# Altium footprint library pre_CONNECTOR.PcbLib: 64 footprints (part 4 of 4)
Each footprint in its own frame and in the unit in brackets; x right, y up, seen from the top. Pads: shape width x height; smd on the part's side, far side on the other; paste and mask are expansions set on the pad; w line width, h text height; cw(c..) or ccw(c..) is an arc to the next point about the centre after c.
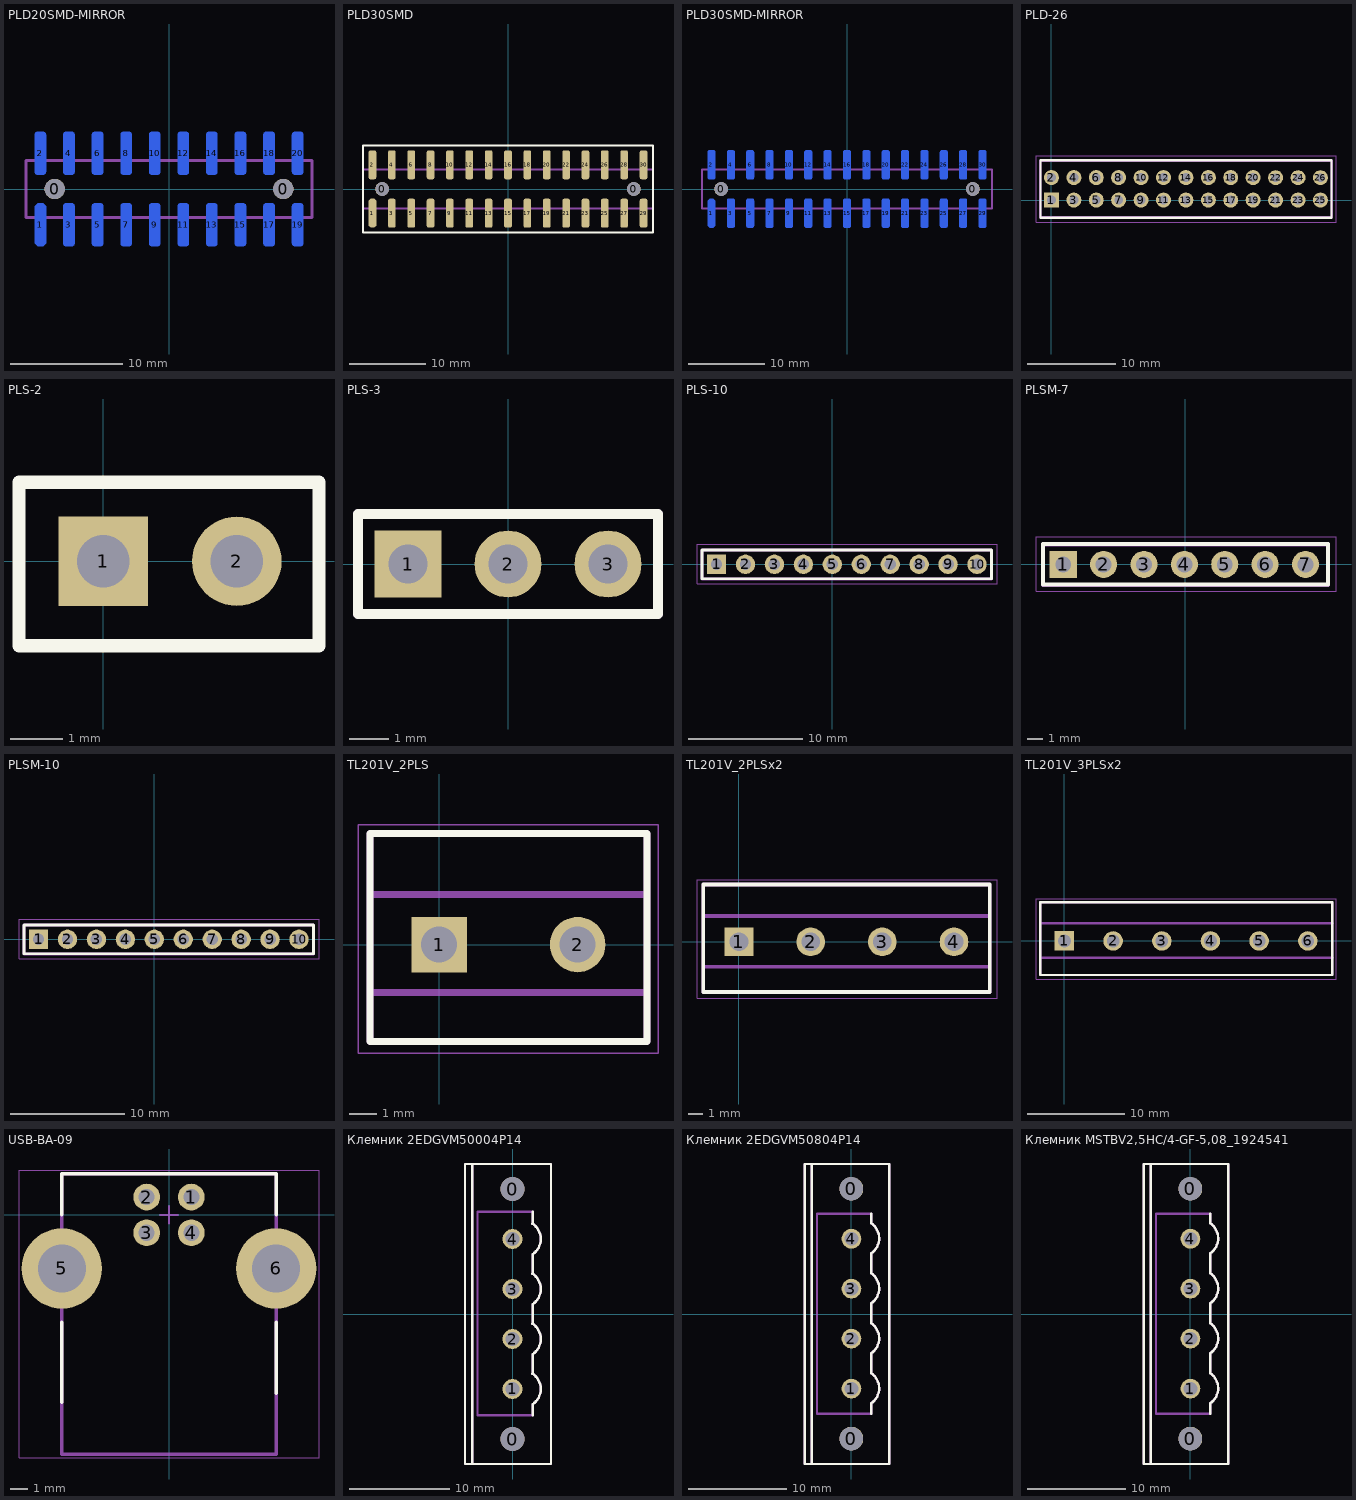
[diagram p3: the footprints below, top view; thin cyan lines are the x and y axes]

## PLD20SMD-MIRROR [mm]
height 3.8
pads (22):
  round 1.8 hole 1.8 unplated: 0(-10.16,0) 0(10.16,0)
  oct 1x3.8 smd far side: 1(-11.43,-3.175)
  rrect50% 1x3.8 smd far side: 2(-11.43,3.175) 3(-8.89,-3.175) 4(-8.89,3.175) 5(-6.35,-3.175) 6(-6.35,3.175) 7(-3.81,-3.175) 8(-3.81,3.175) 9(-1.27,-3.175) 10(-1.27,3.175) 11(1.27,-3.175) 12(1.27,3.175) 13(3.81,-3.175) 14(3.81,3.175) 15(6.35,-3.175) 16(6.35,3.175) 17(8.89,-3.175) 18(8.89,3.175) 19(11.43,-3.175) 20(11.43,3.175)
Bottom Overlay:
  lines w0.254: -12.7,-5.715 12.7,-5.715 12.7,5.715 -12.7,5.715 -12.7,-5.715
Bottom Assy:
  lines w0.254: -12.7,-2.54 12.7,-2.54 12.7,2.54 -12.7,2.54 -12.7,-2.54
3D body: height 3.8, standoff 0, extent -12.7,-2.54 12.7,2.54

## PLD30SMD [mm]
height 3.8
pads (32):
  round 1.8 hole 1.8 unplated: 0(-16.51,0) 0(16.51,0)
  oct 1x3.8 smd: 1(-17.78,-3.175)
  rrect50% 1x3.8 smd: 2(-17.78,3.175) 3(-15.24,-3.175) 4(-15.24,3.175) 5(-12.7,-3.175) 6(-12.7,3.175) 7(-10.16,-3.175) 8(-10.16,3.175) 9(-7.62,-3.175) 10(-7.62,3.175) 11(-5.08,-3.175) 12(-5.08,3.175) 13(-2.54,-3.175) 14(-2.54,3.175) 15(0,-3.175) 16(0,3.175) 17(2.54,-3.175) 18(2.54,3.175) 19(5.08,-3.175) 20(5.08,3.175) 21(7.62,-3.175) 22(7.62,3.175) 23(10.16,-3.175) 24(10.16,3.175) 25(12.7,-3.175) 26(12.7,3.175) 27(15.24,-3.175) 28(15.24,3.175) 29(17.78,-3.175) 30(17.78,3.175)
Top Overlay:
  lines w0.254: -19.05,-5.715 19.05,-5.715 19.05,5.715 -19.05,5.715 -19.05,-5.715
Top Assy:
  lines w0.254: -19.05,-2.54 19.05,-2.54 19.05,2.54 -19.05,2.54 -19.05,-2.54
3D body: height 3.8, standoff 0, extent -19.05,-2.54 19.05,2.54

## PLD30SMD-MIRROR [mm]
height 3.8
pads (32):
  round 1.8 hole 1.8 unplated: 0(-16.51,0) 0(16.51,0)
  oct 1x3.8 smd far side: 1(-17.78,-3.175)
  rrect50% 1x3.8 smd far side: 2(-17.78,3.175) 3(-15.24,-3.175) 4(-15.24,3.175) 5(-12.7,-3.175) 6(-12.7,3.175) 7(-10.16,-3.175) 8(-10.16,3.175) 9(-7.62,-3.175) 10(-7.62,3.175) 11(-5.08,-3.175) 12(-5.08,3.175) 13(-2.54,-3.175) 14(-2.54,3.175) 15(0,-3.175) 16(0,3.175) 17(2.54,-3.175) 18(2.54,3.175) 19(5.08,-3.175) 20(5.08,3.175) 21(7.62,-3.175) 22(7.62,3.175) 23(10.16,-3.175) 24(10.16,3.175) 25(12.7,-3.175) 26(12.7,3.175) 27(15.24,-3.175) 28(15.24,3.175) 29(17.78,-3.175) 30(17.78,3.175)
Bottom Overlay:
  lines w0.254: -19.05,-5.715 -19.05,5.715 19.05,5.715 19.05,-5.715 -19.05,-5.715
Bottom Assy:
  lines w0.254: -19.05,-2.54 -19.05,2.54 19.05,2.54 19.05,-2.54 -19.05,-2.54
3D body: height 3.8, standoff 0, extent -19.05,-2.54 19.05,2.54

## PLD-26 [mm]
pads (26):
  rect 1.7x1.7 hole 1: 1(0,0)
  round 1.7 hole 1: 2(0,2.54) 3(2.54,0) 4(2.54,2.54) 5(5.08,0) 6(5.08,2.54) 7(7.62,0) 8(7.62,2.54) 9(10.16,0) 10(10.16,2.54) 11(12.7,0) 12(12.7,2.54) 13(15.24,0) 14(15.24,2.54) 15(17.78,0) 16(17.78,2.54) 17(20.32,0) 18(20.32,2.54) 19(22.86,0) 20(22.86,2.54) 21(25.41,-0.01) 22(25.41,2.53) 23(27.95,-0.01) 24(27.95,2.53) 25(30.49,-0.01) 26(30.49,2.53)
Top Overlay:
  lines w0.254: -1.25,-2 -1.25,4.5 31.75,4.5 31.75,-2 -1.25,-2
Top Assy:
  lines w0.254: 13.07,-1.96 17.52,-1.96 ; 13.07,-1.94 -1.26,-1.94 -1.26,4.46 31.76,4.46 31.76,-1.94 17.47,-1.94
Mechanical 13:
  lines w0.1: -1.25,-2 31.75,-2 31.75,4.5 -1.25,4.5 -1.25,-2
Mechanical 15:
  lines w0.05: -1.75,-2.5 -1.75,5 32.25,5 32.25,-2.5 -1.75,-2.5
3D body "User Library-PLD-20.step": height 8.54, standoff -2.96, extent -1.25,-1.23 24.15,3.85
3D body "User Library-PLD-6.step": height 8.5, standoff -3, extent 24.1,-1.25 31.72,3.75

## PLS-2 [mm]
pads (2):
  rect 1.7x1.7 hole 1: 1(0,0)
  round 1.7 hole 1: 2(2.54,0)
Top Overlay:
  lines w0.254: -1.6,-1.6 -1.6,1.5 4.1,1.5 4.1,-1.6 -1.6,-1.6

## PLS-3 [mm]
height 8.54
pads (3):
  rect 1.7x1.7 hole 1: 1(-2.54,0)
  round 1.7 hole 1: 2(0,0) 3(2.54,0)
Top Overlay:
  lines w0.254: -3.81,-1.27 3.81,-1.27 3.81,1.27 -3.81,1.27 -3.81,-1.27
Top Assy:
  lines w0.254: -3.81,-1.27 -3.81,1.27 3.81,1.27 3.81,-1.27 -3.81,-1.27

## PLS-10 [mm]
pads (10):
  rect 1.7x1.7 hole 1: 1(-10.16,0)
  round 1.7 hole 1: 2(-7.62,0) 3(-5.08,0) 4(-2.54,0) 5(0,0) 6(2.54,0) 7(5.08,0) 8(7.62,0) 9(10.16,0) 10(12.7,0)
Top Overlay:
  lines w0.254: -11.43,-1.27 13.97,-1.27 ; -11.43,-1.25 -11.43,1.27 13.97,1.27 13.97,-1.25
Top Assy:
  lines w0.254: -11.425,-1.3 13.975,-1.3 13.975,1.25 -11.425,1.25 -11.425,-1.275
Mechanical 13:
  lines w0.1: -11.4,-1.25 14,-1.25 ; -11.375,-1.275 -11.375,1.25 ; -11.375,1.225 13.975,1.249 ; 14,-1.275 14,1.25
Mechanical 15:
  lines w0.05: -11.875,-1.7 -11.875,1.75 14.45,1.75 14.45,-1.7 -11.875,-1.7
  lines w0.1: -0.5,0 0.5,0
3D body "User Library-PLS-10.step": height 8.54, standoff -3, extent -11.5,-1.29 13.9,1.25

## PLSM-7 [mm]
height 3
pads (7):
  rect 1.7x1.7 hole 1: 1(-7.66,0)
  round 1.7 hole 1: 2(-5.12,0) 3(-2.58,0) 4(-0.04,0) 5(2.5,0) 6(5.04,0) 7(7.58,0)
Top Overlay:
  lines w0.254: -8.93,-1.27 9,-1.27 9,1.27 -8.93,1.27 -8.93,-1.25
Top Assy:
  lines w0.254: -8.925,-1.3 9,-1.3 9,1.25 -8.925,1.25 -8.925,-1.275
Mechanical 13:
  lines w0.1: -8.9,-1.25 9,-1.25 9,1.242 -8.875,1.225 ; -8.875,-1.275 -8.875,1.25
Mechanical 15:
  lines w0.05: -9.375,-1.7 -9.375,1.75 9.5,1.75 9.5,-1.7 -9.375,-1.7
  lines w0.1: 2,0 3,0
3D body: height 3, standoff 0, extent -8.925,-1.25 9,1.275

## PLSM-10 [mm]
height 3
pads (10):
  rect 1.7x1.7 hole 1: 1(-10.16,0)
  round 1.7 hole 1: 2(-7.62,0) 3(-5.08,0) 4(-2.54,0) 5(0,0) 6(2.54,0) 7(5.08,0) 8(7.62,0) 9(10.16,0) 10(12.7,0)
Top Overlay:
  lines w0.254: -11.43,-1.27 13.97,-1.27 ; -11.43,-1.25 -11.43,1.27 13.97,1.27 13.97,-1.25
Top Assy:
  lines w0.254: -11.425,-1.3 13.975,-1.3 13.975,1.25 -11.425,1.25 -11.425,-1.275
Mechanical 13:
  lines w0.1: -11.4,-1.25 14,-1.25 ; -11.375,-1.275 -11.375,1.25 ; -11.375,1.225 13.975,1.249 ; 14,-1.275 14,1.25
Mechanical 15:
  lines w0.05: -11.875,-1.7 14.45,-1.7 14.45,1.75 -11.875,1.75 -11.875,-1.7
  lines w0.1: -0.5,0 0.5,0
3D body: height 3, standoff 0, extent -11.425,-1.25 13.975,1.275

## TL201V_2PLS [mm]
height 10
pads (2):
  rect 2x2 hole 1.3: 1(0,0)
  round 2 hole 1.3: 2(5,0)
Top Overlay:
  lines w0.254: -2.5,-3.5 -2.5,4 7.5,4 7.5,-3.5 -2.5,-3.5
Top Assy:
  lines w0.254: -2.475,-1.725 7.5,-1.725 ; -2.475,1.8 7.5,1.8 ; -2.5,-3.5 -2.5,4 7.5,4 7.5,-3.5 -2.5,-3.5
Mechanical 13:
  lines w0.1: -2.5,-3.5 7.5,-3.5 7.5,4.026 -2.5,4.007 -2.5,-3.5
Mechanical 15:
  lines w0.05: -2.925,-3.925 -2.925,4.325 7.9,4.325 7.9,-3.925 -2.925,-3.925
  lines w0.1: -0.5,0 0.5,0
3D body: height 10, standoff 0, extent -2.526,-3.45 7.475,4

## TL201V_2PLSx2 [mm]
height 10
pads (4):
  rect 2x2 hole 1.3: 1(0,0)
  round 2 hole 1.3: 2(5,0) 3(10,0) 4(15,0)
Top Overlay:
  lines w0.254: -2.5,-3.5 -2.5,4 17.5,4 17.5,-3.5 -2.5,-3.5
Top Assy:
  lines w0.254: -2.475,-1.725 17.5,-1.725 ; -2.475,1.8 17.5,1.8 ; -2.5,-3.5 -2.5,4 17.5,4 17.5,-3.5 -2.5,-3.5
Mechanical 13:
  lines w0.1: -2.5,-3.5 17.5,-3.5 17.5,4.026 -2.5,4.007 -2.5,-3.5
Mechanical 15:
  lines w0.05: -2.925,-3.925 -2.925,4.325 18,4.325 18,-3.925 -2.925,-3.925
  lines w0.1: -0.5,0 0.5,0
3D body: height 10, standoff 0, extent -2.526,-3.45 17.5,4

## TL201V_3PLSx2 [mm]
height 10
pads (6):
  rect 2x2 hole 1.3: 1(0,0)
  round 2 hole 1.3: 2(5,0) 3(10,0) 4(15,0) 5(20,0) 6(25,0)
Top Overlay:
  lines w0.254: -2.5,-3.5 27.525,-3.5 27.525,4 -2.5,4 -2.5,-3.5
Top Assy:
  lines w0.254: -2.475,-1.725 27.55,-1.725 ; -2.475,1.8 27.55,1.8 ; -2.5,-3.5 27.525,-3.5 27.525,4 -2.5,4 -2.5,-3.5
Mechanical 13:
  lines w0.1: -2.5,-3.5 -2.5,4.007 27.5,4.036 27.5,-3.5 -2.5,-3.5
Mechanical 15:
  lines w0.05: -2.925,-3.925 27.9,-3.925 27.9,4.325 -2.925,4.325 -2.925,-3.925
  lines w0.1: -0.5,0 0.5,0
3D body: height 10, standoff 0, extent -2.526,-3.45 27.575,4

## USB-BA-09 [mm]
height 11.5
pads (6):
  round 1.5 hole 0.9: 1(1.25,1) 2(-1.25,1) 3(-1.25,-1) 4(1.25,-1)
  round 4.5 hole 2.7: 5(-6,-3) 6(6,-3)
Top Overlay:
  lines w0.2: -6,-10.5 -6,-6 ; -6,0 -6,2.3 6,2.3 6,0 ; 6,-10 6,-6
Top Assy:
  lines w0.2: -6,-13.4 -6,2.3 6,2.3 6,-13.4 -6,-13.4
Mechanical 13:
  lines w0.1: -6,-13.4 -6,2.3 6,2.3 6,-13.4 -6,-13.4
Mechanical 15:
  lines w0.05: -8.4,-13.6 -8.4,2.5 8.4,2.5 8.4,-13.6 -8.4,-13.6
  lines w0.1: -0.5,0 0.5,0 ; 0,-0.5 0,0.5
3D body: height 11.5, standoff 0, extent -6.05,-13.45 6.05,2.35

## Клемник 2EDGVM50004P14 [mm] "XS?"
height 12.1
pads (6):
  round 2.4 hole 2.4: 0(0,-12.5) 0(0,12.5)
  round 2 hole 1.4: 1(0,-7.5) 2(0,-2.5) 3(0,2.5) 4(0,7.5)
Top Overlay:
  lines w0.25: -4.05,-15 -4.05,15 ; 1.994,-5.955 cw(c0.96,-7.5) 2.007,-9.036 ; 1.994,-0.955 cw(c0.96,-2.5) 2.007,-4.036 ; 1.994,4.045 cw(c0.96,2.5) 2.007,0.964 ; 1.994,9.045 cw(c0.96,7.5) 2.007,5.964 ; 2,-10.11 2,-9.05 ; 2,-5.97 2,-4.036 ; 2,-0.955 2,0.964 ; 2,4.045 2,5.964 ; 2,9.045 2,10.21 ; -4.75,-15 -4.75,15 3.85,15 3.85,-15 -4.75,-15
Mechanical 13:
  circle w0.25: c-0.35,-12.5 r0.6
  circle w0.25: c-0.35,12.5 r0.6
  lines w0.25: -4.05,-15 -4.05,15 ; 1.994,-5.955 cw(c0.96,-7.5) 2.007,-9.036 ; 1.994,-0.955 cw(c0.96,-2.5) 2.007,-4.036 ; 1.994,4.045 cw(c0.96,2.5) 2.007,0.964 ; 1.994,9.045 cw(c0.96,7.5) 2.007,5.964 ; 2,-9.05 2,-10.11 0,-10.11 -3.5,-10.11 -3.5,10.21 0,10.21 2,10.21 2,9.075 ; 2,-5.97 2,-4.144 ; 2,-0.9 2,0.911 ; 2,4.19 2,5.964 ; -4.75,-15 -4.75,15 3.85,15 3.85,-15 -4.75,-15
3D body "38043.stp": height 12.5, standoff -3.4, extent -4.725,-15.245 3.875,15.235

## Клемник 2EDGVM50804P14 [mm] "XS?"
height 12.1
pads (6):
  round 2.4 hole 2.4: 0(0,-12.65) 0(0,12.75)
  round 2 hole 1.4: 1(0,-7.57) 2(0,-2.49) 3(0,2.59) 4(0,7.67)
Top Overlay:
  lines w0.25: -4.05,-15.23 -4.05,15.27 ; 1.994,-5.975 cw(c0.96,-7.52) 2.007,-9.056 ; 1.994,-0.895 cw(c0.96,-2.44) 2.007,-3.976 ; 1.994,4.185 cw(c0.96,2.64) 2.007,1.104 ; 1.994,9.265 cw(c0.96,7.72) 2.007,6.184 ; 2,-10.11 2,-9.05 ; 2,-5.97 2,-3.98 ; 2,-0.9 2,1.1 ; 2,4.19 2,6.18 ; 2,9.26 2,10.21 ; -4.75,-15.23 3.85,-15.23 3.85,15.27 -4.75,15.27 -4.75,-15.23
Mechanical 13:
  circle w0.25: c-0.35,12.75 r0.6
  circle w0.25: c-0.35,-12.65 r0.6
  lines w0.25: -4.05,-15.23 -4.05,15.27 ; 1.994,-5.975 cw(c0.96,-7.52) 2.007,-9.056 ; 1.994,-0.895 cw(c0.96,-2.44) 2.007,-3.976 ; 1.994,4.185 cw(c0.96,2.64) 2.007,1.104 ; 1.994,9.265 cw(c0.96,7.72) 2.007,6.184 ; 2,-9.05 2,-10.11 0,-10.11 -3.5,-10.11 -3.5,10.21 0,10.21 2,10.21 2,9.26 ; 2,-5.97 2,-3.98 ; 2,-0.9 2,1.1 ; 2,4.19 2,6.18 ; -4.75,-15.23 3.85,-15.23 3.85,15.27 -4.75,15.27 -4.75,-15.23
3D body "38043.stp": height 12.52, standoff -3.38, extent -4.75,-15.22 3.85,15.26

## Клемник MSTBV2,5HC/4-GF-5,08_1924541 [mm] "XS?"
height 12.1
pads (6):
  round 2.4 hole 2.4: 0(0,-12.65) 0(0,12.75)
  round 2 hole 1.4: 1(0,-7.57) 2(0,-2.49) 3(0,2.59) 4(0,7.67)
Top Overlay:
  lines w0.25: -4.05,-15.23 -4.05,15.27 ; 1.994,-5.975 cw(c0.96,-7.52) 2.007,-9.056 ; 1.994,-0.895 cw(c0.96,-2.44) 2.007,-3.976 ; 1.994,4.185 cw(c0.96,2.64) 2.007,1.104 ; 1.994,9.265 cw(c0.96,7.72) 2.007,6.184 ; 2,-10.11 2,-9.05 ; 2,-5.97 2,-3.98 ; 2,-0.9 2,1.1 ; 2,4.19 2,6.18 ; 2,9.26 2,10.21 ; -4.75,-15.23 -4.75,15.27 3.85,15.27 3.85,-15.23 -4.75,-15.23
Mechanical 13:
  circle w0.25: c-0.35,-12.65 r0.6
  circle w0.25: c-0.35,12.75 r0.6
  lines w0.25: -4.05,-15.23 -4.05,15.27 ; 1.994,-5.975 cw(c0.96,-7.52) 2.007,-9.056 ; 1.994,-0.895 cw(c0.96,-2.44) 2.007,-3.976 ; 1.994,4.185 cw(c0.96,2.64) 2.007,1.104 ; 1.994,9.265 cw(c0.96,7.72) 2.007,6.184 ; 2,-9.05 2,-10.11 0,-10.11 -3.5,-10.11 -3.5,10.21 0,10.21 2,10.21 2,9.26 ; 2,-5.97 2,-3.98 ; 2,-0.9 2,1.1 ; 2,4.19 2,6.18 ; -4.75,-15.23 -4.75,15.27 3.85,15.27 3.85,-15.23 -4.75,-15.23
3D body "1924541.stp": height 12, standoff -3.9, extent -4.75,-15.22 3.85,15.26